# Altium footprint library 全库.PcbLib: 967 footprints (part 5 of 61)
Each footprint in its own frame and in the unit in brackets; x right, y up, seen from the top. Pads: shape width x height; smd on the part's side, far side on the other; paste and mask are expansions set on the pad; w line width, h text height; cw(c..) or ccw(c..) is an arc to the next point about the centre after c.
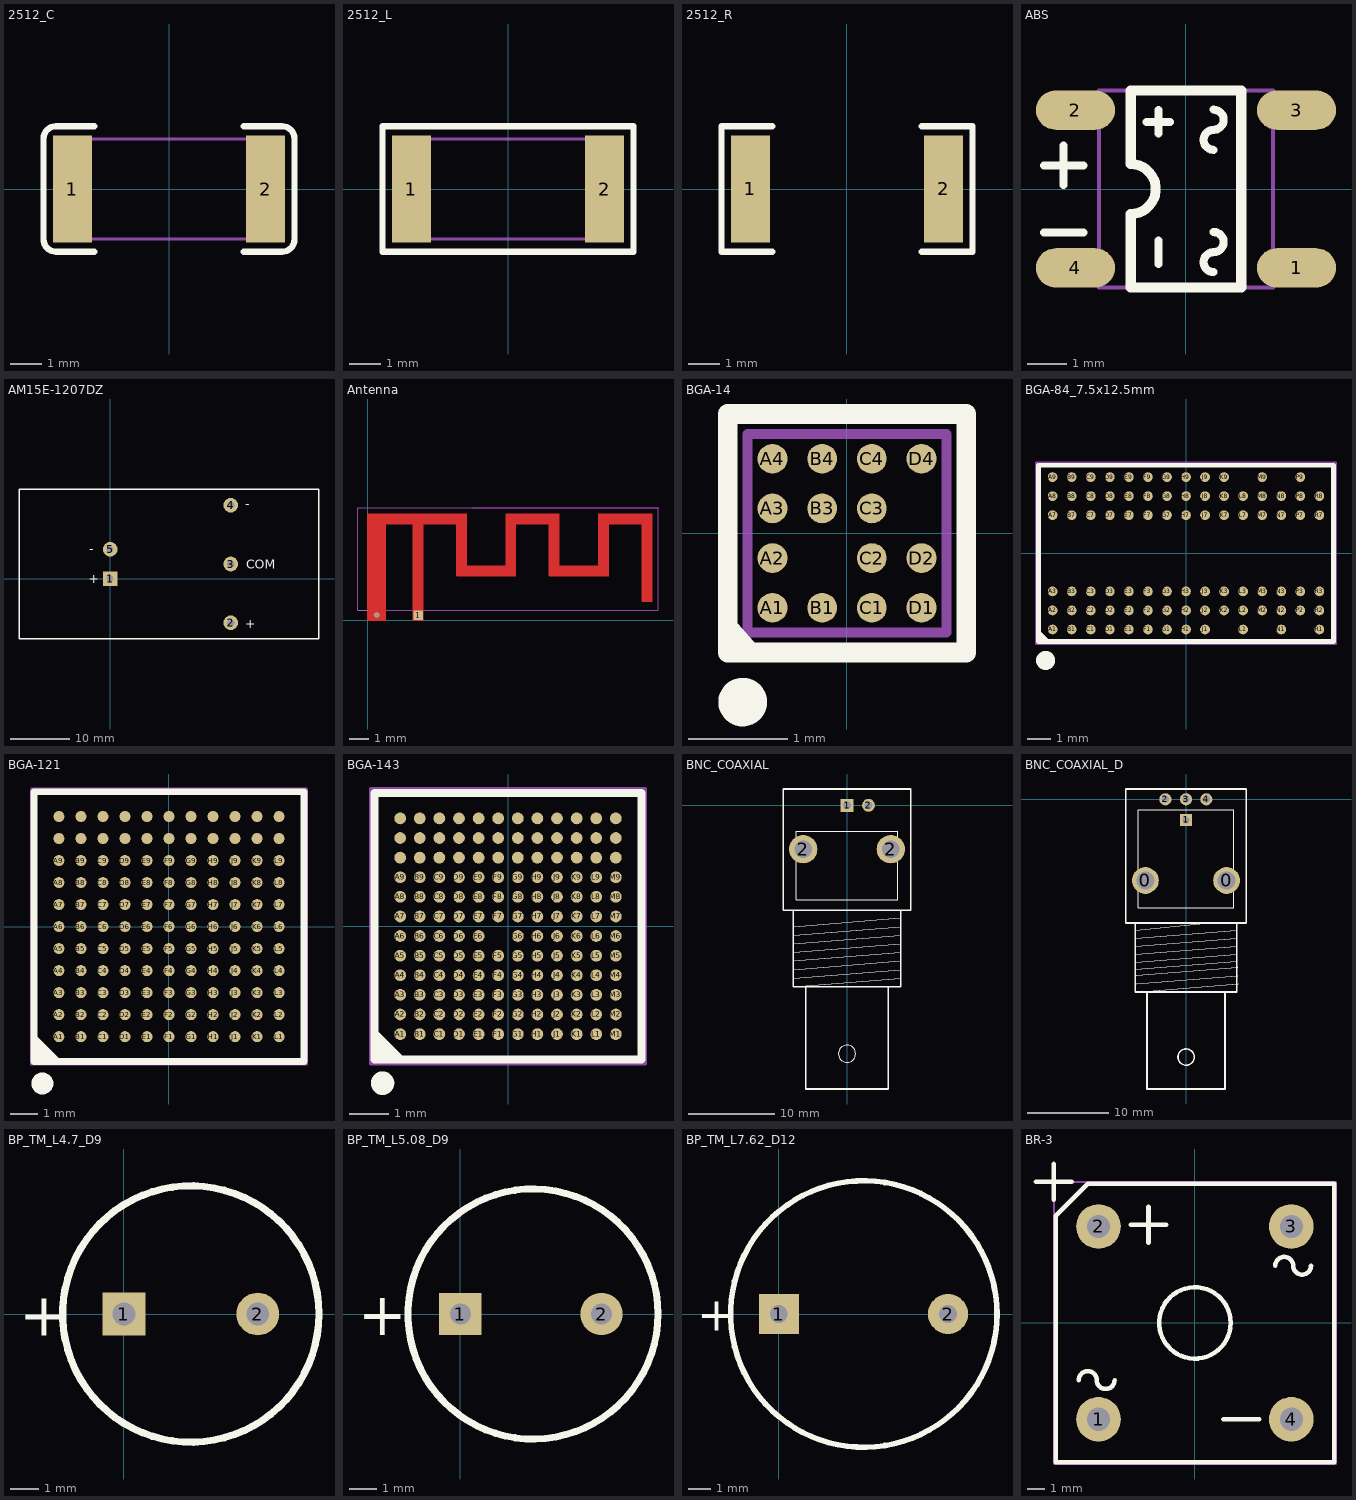
[diagram p4: the footprints below, top view; thin cyan lines are the x and y axes]

## 2512_C [mm]
pads (2):
  rect 1.25x3.42 smd: 1(-3.1,0) 2(3.1,0)
Top Overlay:
  lines w0.203: -2.4,-2.01 -3.625,-2.01 cw(c-3.625,-1.61) -4.025,-1.61 -4.025,1.61 cw(c-3.625,1.61) -3.625,2.01 -2.4,2.01 ; 2.4,-2.01 3.625,-2.01 ccw(c3.625,-1.61) 4.025,-1.61 4.025,1.61 ccw(c3.625,1.61) 3.625,2.01 2.4,2.01
Mechanical 13:
  lines w0.1: -3.15,-1.6 -3.15,1.6 3.15,1.6 3.15,-1.6 -3.15,-1.6

## 2512_L [mm]
pads (2):
  rect 1.25x3.42 smd: 1(-3.1,0) 2(3.1,0)
Top Overlay:
  lines w0.2: -4.025,-2.01 4.025,-2.01 4.025,2.01 -4.025,2.01 -4.025,-2.01
Mechanical 13:
  lines w0.1: -3.15,-1.6 3.15,-1.6 3.15,1.6 -3.15,1.6 -3.15,-1.6

## 2512_R [mm]
pads (2):
  rect 1.25x3.42 smd: 1(-3.1,0) 2(3.1,0)
Top Overlay:
  lines w0.2: -2.4,-2.01 -4.025,-2.01 -4.025,2.01 -2.4,2.01 ; 2.4,-2.01 4.025,-2.01 4.025,2.01 2.4,2.01
3D body "User Library-res2512_body.STEP": height 0.62, standoff 0, extent -3.159,-1.6 3.16,1.6

## ABS [mm]
pads (4):
  oval 2x1 smd: 1(2.8,-2) 2(-2.8,2) 3(2.8,2) 4(-2.8,-2)
Top Overlay:
  lines w0.203: -3.6,-1.1 -2.6,-1.1 ; -3.6,0.6 -2.6,0.6 ; -3.1,0.1 -3.1,1.1 ; -1,1.7 -0.4,1.7 ; -0.7,-1.9 -0.7,-1.3 ; -0.7,1.4 -0.7,2 ; 0.7,-2.108 cw(c0.7,-1.854) 0.7,-1.6 ccw(c0.7,-1.346) 0.7,-1.092 ; 0.7,0.992 cw(c0.7,1.246) 0.7,1.5 ccw(c0.7,1.754) 0.7,2.008
  lines w0.254: -1.4,-2.5 -1.4,-0.635 ccw(c-1.4,0) -1.4,0.635 -1.4,2.5 1.4,2.5 1.4,-2.5 -1.4,-2.5
Mechanical 13:
  lines w0.1: -2.2,-2.5 -2.2,2.5 2.2,2.5 2.2,-2.5 -2.2,-2.5

## AM15E-1207DZ [mm]
pads (5):
  rect 2.5x2.5 hole 1.2: 1(0,0)
  round 2.5 hole 1.2: 2(20.5,-7.5) 3(20.5,2.5) 4(20.5,12.5) 5(0,5)
Top Overlay:
  lines w0.254: -15.5,-10.25 -15.5,15.25 35.5,15.25 35.5,-10.25 -15.5,-10.25
  text "COM" at 23.114,1.651 h1.52
  text "-" at 22.987,11.938 h1.52
  text "+" at 22.987,-8.382 h1.52
  text "+" at -3.683,-0.762 h1.52
  text "-" at -3.556,4.318 h1.52

## Antenna [mm]
pads (1):
  rect 0.5x0.5 smd: 1(2.55,0.25)
via 0.45,0.25 diameter 0.254 hole 0.203
Top Layer:
  lines w0.025: 0,0.013 0.9,0.013 ; 0,0.038 0.9,0.038 ; 0,0.064 0.9,0.064 ; 0,0.089 0.9,0.089 ; 0,0.114 0.9,0.114 ; 0,0.14 0.9,0.14 ; 0,0.165 0.9,0.165 ; 0,0.191 0.9,0.191 ; 0,0.216 0.9,0.216 ; 0,0.241 0.9,0.241 ; 0,0.267 0.9,0.267 ; 0,0.292 0.9,0.292 ; 0,0.318 0.9,0.318 ; 0,0.343 0.9,0.343 ; 0,0.368 0.9,0.368 ; 0,0.394 0.9,0.394 ; 0,0.419 0.9,0.419 ; 0,0.445 0.9,0.445 ; 0,0.47 0.9,0.47 ; 0,0.495 0.9,0.495 ; 0,0.521 0.9,0.521 ; 0,0.546 0.9,0.546 ; 0,0.572 0.9,0.572 ; 0,0.597 0.9,0.597 ; 0,0.622 0.9,0.622 ; 0,0.648 0.9,0.648 ; 0,0.673 0.9,0.673 ; 0,0.699 0.9,0.699 ; 0,0.724 0.9,0.724 ; 0,0.749 0.9,0.749 ; 0,0.775 0.9,0.775 ; 0,0.8 0.9,0.8 ; 0,0.826 0.9,0.826 ; 0,0.851 0.9,0.851 ; 0,0.876 0.9,0.876 ; 0,0.902 0.9,0.902 ; 0,0.927 0.9,0.927 ; 0,0.953 0.9,0.953 ; 0,0.978 0.9,0.978 ; 0,1.003 0.9,1.003 ; 0,1.029 0.9,1.029 ; 0,1.054 0.9,1.054 ; 0,1.079 0.9,1.079 ; 0,1.105 0.9,1.105 ; 0,1.13 0.9,1.13 ; 0,1.156 0.9,1.156 ; 0,1.181 0.9,1.181 ; 0,1.206 0.9,1.206 ; 0,1.232 0.9,1.232 ; 0,1.257 0.9,1.257 ; 0,1.283 0.9,1.283 ; 0,1.308 0.9,1.308 ; 0,1.333 0.9,1.333 ; 0,1.359 0.9,1.359 ; 0,1.384 0.9,1.384 ; 0,1.41 0.9,1.41 ; 0,1.435 0.9,1.435 ; 0,1.46 0.9,1.46 ; 0,1.486 0.9,1.486 ; 0,1.511 0.9,1.511 ; 0,1.537 0.9,1.537 ; 0,1.562 0.9,1.562 ; 0,1.587 0.9,1.587 ; 0,1.613 0.9,1.613 ; 0,1.638 0.9,1.638 ; 0,1.664 0.9,1.664 ; 0,1.689 0.9,1.689 ; 0,1.714 0.9,1.714 ; 0,1.74 0.9,1.74 ; 0,1.765 0.9,1.765 ; 0,1.791 0.9,1.791 ; 0,1.816 0.9,1.816 ; 0,1.841 0.9,1.841 ; 0,1.867 0.9,1.867 ; 0,1.892 0.9,1.892 ; 0,1.918 0.9,1.918 ; 0,1.943 0.9,1.943 ; 0,1.968 0.9,1.968 ; 0,1.994 0.9,1.994 ; 0,2.019 0.9,2.019 ; 0,2.045 0.9,2.045 ; 0,2.07 0.9,2.07 ; 0,2.095 0.9,2.095 ; 0,2.121 0.9,2.121 ; 0,2.146 0.9,2.146 ; 0,2.172 0.9,2.172 ; 0,2.197 0.9,2.197 ; 0,2.222 0.9,2.222 ; 0,2.248 0.9,2.248 ; 0,2.273 0.9,2.273 ; 0,2.299 0.9,2.299 ; 0,2.324 0.9,2.324 ; 0,2.349 0.9,2.349 ; 0,2.375 0.9,2.375 ; 0,2.4 0.9,2.4 ; 0,2.426 0.9,2.426 ; 0,2.451 0.9,2.451 ; 0,2.476 0.9,2.476 ; 0,2.502 0.9,2.502 ; 0,2.527 0.9,2.527 ; 0,2.553 0.9,2.553 ; 0,2.578 0.9,2.578 ; 0,2.603 0.9,2.603 ; 0,2.629 0.9,2.629 ; 0,2.654 0.9,2.654 ; 0,2.68 0.9,2.68 ; 0,2.705 0.9,2.705 ; 0,2.73 0.9,2.73 ; 0,2.756 0.9,2.756 ; 0,2.781 0.9,2.781 ; 0,2.807 0.9,2.807 ; 0,2.832 0.9,2.832 ; 0,2.857 0.9,2.857 ; 0,2.883 0.9,2.883 ; 0,2.908 0.9,2.908 ; 0,2.934 0.9,2.934 ; 0,2.959 0.9,2.959 ; 0,2.984 0.9,2.984 ; 0,3.01 0.9,3.01 ; 0,3.035 0.9,3.035 ; 0,3.061 0.9,3.061 ; 0,3.086 0.9,3.086 ; 0,3.111 0.9,3.111 ; 0,3.137 0.9,3.137 ; 0,3.162 0.9,3.162 ; 0,3.188 0.9,3.188 ; 0,3.213 0.9,3.213 ; 0,3.238 0.9,3.238 ; 0,3.264 0.9,3.264 ; 0,3.289 0.9,3.289 ; 0,3.315 0.9,3.315 ; 0,3.34 0.9,3.34 ; 0,3.365 0.9,3.365 ; 0,3.391 0.9,3.391 ; 0,3.416 0.9,3.416 ; 0,3.442 0.9,3.442 ; 0,3.467 0.9,3.467 ; 0,3.492 0.9,3.492 ; 0,3.518 0.9,3.518 ; 0,3.543 0.9,3.543 ; 0,3.569 0.9,3.569 ; 0,3.594 0.9,3.594 ; 0,3.619 0.9,3.619 ; 0,3.645 0.9,3.645 ; 0,3.67 0.9,3.67 ; 0,3.696 0.9,3.696 ; 0,3.721 0.9,3.721 ; 0,3.746 0.9,3.746 ; 0,3.772 0.9,3.772 ; 0,3.797 0.9,3.797 ; 0,3.823 0.9,3.823 ; 0,3.848 0.9,3.848 ; 0,3.873 0.9,3.873 ; 0,3.899 0.9,3.899 ; 0,3.924 0.9,3.924 ; 0,3.95 0.9,3.95 ; 0,3.975 0.9,3.975 ; 0,4 0.9,4 ; 0,4.026 0.9,4.026 ; 0,4.051 0.9,4.051 ; 0,4.077 0.9,4.077 ; 0,4.102 0.9,4.102 ; 0,4.127 0.9,4.127 ; 0,4.153 0.9,4.153 ; 0,4.178 0.9,4.178 ; 0,4.204 0.9,4.204 ; 0,4.229 0.9,4.229 ; 0,4.255 0.9,4.255 ; 0,4.28 0.9,4.28 ; 0,4.305 0.9,4.305 ; 0,4.331 0.9,4.331 ; 0,4.356 0.9,4.356 ; 0,4.381 0.9,4.381 ; 0,4.407 0.9,4.407 ; 0,4.432 0.9,4.432 ; 0,4.458 0.9,4.458 ; 0,4.483 0.9,4.483 ; 0,4.508 0.9,4.508 ; 0,4.534 0.9,4.534 ; 0,4.559 0.9,4.559 ; 0,4.585 0.9,4.585 ; 0,4.61 0.9,4.61 ; 0,4.635 0.9,4.635 ; 0,4.661 0.9,4.661 ; 0,4.686 0.9,4.686 ; 0,4.712 0.9,4.712 ; 0,4.737 0.9,4.737 ; 0,4.763 0.9,4.763 ; 0,4.788 0.9,4.788 ; 0,4.813 0.9,4.813 ; 0,4.839 0.9,4.839 ; 0,4.864 0.9,4.864 ; 0,4.903 5,4.903 ; 0,4.915 0.9,4.915 ; 0,4.928 5,4.928 ; 0,4.94 0.9,4.94 ; 0,4.953 5,4.953 ; 0,4.966 0.9,4.966 ; 0,4.979 5,4.979 ; 0,4.991 0.9,4.991 ; 0,5.004 5,5.004 ; 0,5.016 0.9,5.016 ; 0,5.03 5,5.03 ; 0,5.042 0.9,5.042 ; 0,5.055 5,5.055 ; 0,5.067 0.9,5.067 ; 0,5.08 5,5.08 ; 0,5.093 0.9,5.093 ; 0,5.106 5,5.106 ; 0,5.118 0.9,5.118 ; 0,5.131 5,5.131 ; 0,5.143 0.9,5.143 ; 0,5.157 5,5.157 ; 0,5.169 0.9,5.169 ; 0,5.182 5,5.182 ; 0,5.194 0.9,5.194 ; 0,5.207 5,5.207 ; 0,5.22 0.9,5.22 ; 0,5.233 5,5.233 ; 0,5.245 0.9,5.245 ; 0,5.258 5,5.258 ; 0,5.271 0.9,5.271 ; 0,5.284 5,5.284 ; 0,5.296 0.9,5.296 ; 0,5.309 5,5.309 ; 0,5.321 0.9,5.321 ; 0,5.334 5,5.334 ; 0,5.347 0.9,5.347 ; 0,5.36 5,5.36 ; 0,5.372 0.9,5.372 ; 0,5.385 5,5.385 ; 0.9,4.889 0,4.889 ; 2.3,0.013 2.8,0.013 ; 2.3,0.038 2.8,0.038 ; 2.3,0.064 2.8,0.064 ; 2.3,0.089 2.8,0.089 ; 2.3,0.114 2.8,0.114 ; 2.3,0.14 2.8,0.14 ; 2.3,0.165 2.8,0.165 ; 2.3,0.191 2.8,0.191 ; 2.3,0.216 2.8,0.216 ; 2.3,0.241 2.8,0.241 ; 2.3,0.267 2.8,0.267 ; 2.3,0.292 2.8,0.292 ; 2.3,0.318 2.8,0.318 ; 2.3,0.343 2.8,0.343 ; 2.3,0.368 2.8,0.368 ; 2.3,0.394 2.8,0.394 ; 2.3,0.419 2.8,0.419 ; 2.3,0.445 2.8,0.445 ; 2.3,0.47 2.8,0.47 ; 2.3,0.495 2.8,0.495 ; 2.3,0.521 2.8,0.521 ; 2.3,0.546 2.8,0.546 ; 2.3,0.572 2.8,0.572 ; 2.3,0.597 2.8,0.597 ; 2.3,0.622 2.8,0.622 ; 2.3,0.648 2.8,0.648 ; 2.3,0.673 2.8,0.673 ; 2.3,0.699 2.8,0.699 ; 2.3,0.724 2.8,0.724 ; 2.3,0.749 2.8,0.749 ; 2.3,0.775 2.8,0.775 ; 2.3,0.8 2.8,0.8 ; 2.3,0.826 2.8,0.826 ; 2.3,0.851 2.8,0.851 ; 2.3,0.876 2.8,0.876 ; 2.3,0.902 2.8,0.902 ; 2.3,0.927 2.8,0.927 ; 2.3,0.953 2.8,0.953 ; 2.3,0.978 2.8,0.978 ; 2.3,1.003 2.8,1.003 ; 2.3,1.029 2.8,1.029 ; 2.3,1.054 2.8,1.054 ; 2.3,1.079 2.8,1.079 ; 2.3,1.105 2.8,1.105 ; 2.3,1.13 2.8,1.13 ; 2.3,1.156 2.8,1.156 ; 2.3,1.181 2.8,1.181 ; 2.3,1.206 2.8,1.206 ; 2.3,1.232 2.8,1.232 ; 2.3,1.257 2.8,1.257 ; 2.3,1.283 2.8,1.283 ; 2.3,1.308 2.8,1.308 ; 2.3,1.333 2.8,1.333 ; 2.3,1.359 2.8,1.359 ; 2.3,1.384 2.8,1.384 ; 2.3,1.41 2.8,1.41 ; 2.3,1.435 2.8,1.435 ; 2.3,1.46 2.8,1.46 ; 2.3,1.486 2.8,1.486 ; 2.3,1.511 2.8,1.511 ; 2.3,1.537 2.8,1.537 ; 2.3,1.562 2.8,1.562 ; 2.3,1.587 2.8,1.587 ; 2.3,1.613 2.8,1.613 ; 2.3,1.638 2.8,1.638 ; 2.3,1.664 2.8,1.664 ; 2.3,1.689 2.8,1.689 ; 2.3,1.714 2.8,1.714 ; 2.3,1.74 2.8,1.74 ; 2.3,1.765 2.8,1.765 ; 2.3,1.791 2.8,1.791 ; 2.3,1.816 2.8,1.816 ; 2.3,1.841 2.8,1.841 ; 2.3,1.867 2.8,1.867 ; 2.3,1.892 2.8,1.892 ; 2.3,1.918 2.8,1.918 ; 2.3,1.943 2.8,1.943 ; 2.3,1.968 2.8,1.968 ; 2.3,1.994 2.8,1.994 ; 2.3,2.019 2.8,2.019 ; 2.3,2.045 2.8,2.045 ; 2.3,2.07 2.8,2.07 ; 2.3,2.095 2.8,2.095 ; 2.3,2.121 2.8,2.121 ; 2.3,2.146 2.8,2.146 ; 2.3,2.172 2.8,2.172 ; 2.3,2.197 2.8,2.197 ; 2.3,2.222 2.8,2.222 ; 2.3,2.248 2.8,2.248 ; 2.3,2.273 2.8,2.273 ; 2.3,2.299 2.8,2.299 ; 2.3,2.324 2.8,2.324 ; 2.3,2.349 2.8,2.349 ; 2.3,2.375 2.8,2.375 ; 2.3,2.4 2.8,2.4 ; 2.3,2.426 2.8,2.426 ; 2.3,2.451 2.8,2.451 ; 2.3,2.476 2.8,2.476 ; 2.3,2.502 2.8,2.502 ; 2.3,2.527 2.8,2.527 ; 2.3,2.553 2.8,2.553 ; 2.3,2.578 2.8,2.578 ; 2.3,2.603 2.8,2.603 ; 2.3,2.629 2.8,2.629 ; 2.3,2.654 2.8,2.654 ; 2.3,2.68 2.8,2.68 ; 2.3,2.705 2.8,2.705 ; 2.3,2.73 2.8,2.73 ; 2.3,2.756 2.8,2.756 ; 2.3,2.781 2.8,2.781 ; 2.3,2.807 2.8,2.807 ; 2.3,2.832 2.8,2.832 ; 2.3,2.857 2.8,2.857 ; 2.3,2.883 2.8,2.883 ; 2.3,2.908 2.8,2.908 ; 2.3,2.934 2.8,2.934 ; 2.3,2.959 2.8,2.959 ; 2.3,2.984 2.8,2.984 ; 2.3,3.01 2.8,3.01 ; 2.3,3.035 2.8,3.035 ; 2.3,3.061 2.8,3.061 ; 2.3,3.086 2.8,3.086 ; 2.3,3.111 2.8,3.111 ; 2.3,3.137 2.8,3.137 ; 2.3,3.162 2.8,3.162 ; 2.3,3.188 2.8,3.188 ; 2.3,3.213 2.8,3.213 ; 2.3,3.238 2.8,3.238 ; 2.3,3.264 2.8,3.264 ; 2.3,3.289 2.8,3.289 ; 2.3,3.315 2.8,3.315 ; 2.3,3.34 2.8,3.34 ; 2.3,3.365 2.8,3.365 ; 2.3,3.391 2.8,3.391 ; 2.3,3.416 2.8,3.416 ; 2.3,3.442 2.8,3.442 ; 2.3,3.467 2.8,3.467 ; 2.3,3.492 2.8,3.492 ; 2.3,3.518 2.8,3.518 ; 2.3,3.543 2.8,3.543 ; 2.3,3.569 2.8,3.569 ; 2.3,3.594 2.8,3.594 ; 2.3,3.619 2.8,3.619 ; 2.3,3.645 2.8,3.645 ; 2.3,3.67 2.8,3.67 ; 2.3,3.696 2.8,3.696 ; 2.3,3.721 2.8,3.721 ; 2.3,3.746 2.8,3.746 ; 2.3,3.772 2.8,3.772 ; 2.3,3.797 2.8,3.797 ; 2.3,3.823 2.8,3.823 ; 2.3,3.848 2.8,3.848 ; 2.3,3.873 2.8,3.873 ; 2.3,3.899 2.8,3.899 ; 2.3,3.924 2.8,3.924 ; 2.3,3.95 2.8,3.95 ; 2.3,3.975 2.8,3.975 ; 2.3,4 2.8,4 ; 2.3,4.026 2.8,4.026 ; 2.3,4.051 2.8,4.051 ; 2.3,4.077 2.8,4.077 ; 2.3,4.102 2.8,4.102 ; 2.3,4.127 2.8,4.127 ; 2.3,4.153 2.8,4.153 ; 2.3,4.178 2.8,4.178 ; 2.3,4.204 2.8,4.204 ; 2.3,4.229 2.8,4.229 ; 2.3,4.255 2.8,4.255 ; 2.3,4.28 2.8,4.28 ; 2.3,4.305 2.8,4.305 ; 2.3,4.331 2.8,4.331 ; 2.3,4.356 2.8,4.356 ; 2.3,4.381 2.8,4.381 ; 2.3,4.407 2.8,4.407 ; 2.3,4.432 2.8,4.432 ; 2.3,4.458 2.8,4.458 ; 2.3,4.483 2.8,4.483 ; 2.3,4.508 2.8,4.508 ; 2.3,4.534 2.8,4.534 ; 2.3,4.559 2.8,4.559 ; 2.3,4.585 2.8,4.585 ; 2.3,4.61 2.8,4.61 ; 2.3,4.635 2.8,4.635 ; 2.3,4.661 2.8,4.661 ; 2.3,4.686 2.8,4.686 ; 2.3,4.712 2.8,4.712 ; 2.3,4.737 2.8,4.737 ; 2.3,4.763 2.8,4.763 ; 2.3,4.788 2.8,4.788 ; 2.3,4.813 2.8,4.813 ; 2.3,4.839 2.8,4.839 ; 2.3,4.864 2.8,4.864 ; 2.3,4.889 2.8,4.889 ; 2.3,4.915 2.8,4.915 ; 2.3,4.94 2.8,4.94 ; 2.3,4.966 2.8,4.966 ; 2.3,4.991 2.8,4.991 ; 2.3,5.016 2.8,5.016 ; 2.3,5.042 2.8,5.042 ; 2.3,5.067 2.8,5.067 ; 2.3,5.093 2.8,5.093 ; 2.3,5.118 2.8,5.118 ; 2.3,5.143 2.8,5.143 ; 2.3,5.169 2.8,5.169 ; 2.3,5.194 2.8,5.194 ; 2.3,5.22 2.8,5.22 ; 2.3,5.245 2.8,5.245 ; 2.3,5.271 2.8,5.271 ; 2.3,5.296 2.8,5.296 ; 2.3,5.321 2.8,5.321 ; 2.3,5.347 2.8,5.347 ; 2.3,5.372 2.8,5.372 ; 4.5,2.771 5,2.771 ; 4.5,2.796 5,2.796 ; 4.5,2.821 5,2.821 ; 4.5,2.847 5,2.847 ; 4.5,2.872 5,2.872 ; 4.5,2.898 5,2.898 ; 4.5,2.923 5,2.923 ; 4.5,2.948 5,2.948 ; 4.5,2.974 5,2.974 ; 4.5,2.999 5,2.999 ; 4.5,3.025 5,3.025 ; 4.5,3.05 5,3.05 ; 4.5,3.075 5,3.075 ; 4.5,3.101 5,3.101 ; 4.5,3.126 5,3.126 ; 4.5,3.152 5,3.152 ; 4.5,3.177 5,3.177 ; 4.5,3.202 5,3.202 ; 4.5,3.228 5,3.228 ; 4.5,3.253 5,3.253 ; 4.5,3.279 5,3.279 ; 4.5,3.304 5,3.304 ; 4.5,3.329 5,3.329 ; 4.5,3.355 5,3.355 ; 4.5,3.38 5,3.38 ; 4.5,3.406 5,3.406 ; 4.5,3.431 5,3.431 ; 4.5,3.456 5,3.456 ; 4.5,3.482 5,3.482 ; 4.5,3.507 5,3.507 ; 4.5,3.533 5,3.533 ; 4.5,3.558 5,3.558 ; 4.5,3.583 5,3.583 ; 4.5,3.609 5,3.609 ; 4.5,3.634 5,3.634 ; 4.5,3.66 5,3.66 ; 4.5,3.685 5,3.685 ; 4.5,3.71 5,3.71 ; 4.5,3.736 5,3.736 ; 4.5,3.761 5,3.761 ; 4.5,3.787 5,3.787 ; 4.5,3.812 5,3.812 ; 4.5,3.837 5,3.837 ; 4.5,3.863 5,3.863 ; 4.5,3.888 5,3.888 ; 4.5,3.914 5,3.914 ; 4.5,3.939 5,3.939 ; 4.5,3.964 5,3.964 ; 4.5,3.99 5,3.99 ; 4.5,4.015 5,4.015 ; 4.5,4.041 5,4.041 ; 4.5,4.066 5,4.066 ; 4.5,4.091 5,4.091 ; 4.5,4.117 5,4.117 ; 4.5,4.142 5,4.142 ; 4.5,4.168 5,4.168 ; 4.5,4.193 5,4.193 ; 4.5,4.218 5,4.218 ; 4.5,4.244 5,4.244 ; 4.5,4.269 5,4.269 ; 4.5,4.295 5,4.295 ; 4.5,4.32 5,4.32 ; 4.5,4.345 5,4.345 ; 4.5,4.371 5,4.371 ; 4.5,4.396 5,4.396 ; 4.5,4.422 5,4.422 ; 4.5,4.447 5,4.447 ; 4.5,4.472 5,4.472 ; 4.5,4.498 5,4.498 ; 4.5,4.523 5,4.523 ; 4.5,4.549 5,4.549 ; 4.5,4.574 5,4.574 ; 4.5,4.599 5,4.599 ; 4.5,4.625 5,4.625 ; 4.5,4.65 5,4.65 ; 4.5,4.676 5,4.676 ; 4.5,4.701 5,4.701 ; 4.5,4.726 5,4.726 ; 4.5,4.752 5,4.752 ; 4.5,4.777 5,4.777 ; 4.5,4.803 5,4.803 ; 4.5,4.828 5,4.828 ; 4.5,4.853 5,4.853 ; 4.5,4.879 5,4.879 ; 4.5,4.904 5,4.904 ; 4.5,4.93 5,4.93 ; 4.5,4.955 5,4.955 ; 4.5,4.98 5,4.98 ; 4.5,5.006 5,5.006 ; 4.5,5.031 5,5.031 ; 4.5,5.057 5,5.057 ; 4.5,5.082 5,5.082 ; 4.5,5.107 5,5.107 ; 4.5,5.133 5,5.133 ; 4.5,5.158 5,5.158 ; 4.5,5.184 5,5.184 ; 4.5,5.209 5,5.209 ; 4.5,5.234 5,5.234 ; 4.5,5.26 5,5.26 ; 4.5,5.285 5,5.285 ; 4.5,5.311 5,5.311 ; 4.5,5.336 5,5.336 ; 4.5,5.361 5,5.361 ; 4.5,5.387 5,5.387 ; 5,2.263 4.5,2.263 7.5,2.263 7,2.263 ; 5,2.288 4.5,2.288 7.5,2.288 7,2.288 ; 5,2.313 4.5,2.313 7.5,2.313 7,2.313 ; 5,2.339 4.5,2.339 7.5,2.339 7,2.339 ; 5,2.364 4.5,2.364 7.5,2.364 7,2.364 ; 5,2.39 4.5,2.39 7.5,2.39 7,2.39 ; 5,2.415 4.5,2.415 7.5,2.415 7,2.415 ; 5,2.44 4.5,2.44 7.5,2.44 7,2.44 ; 5,2.466 4.5,2.466 7.5,2.466 7,2.466 ; 5,2.491 4.5,2.491 7.5,2.491 7,2.491 ; 5,2.517 4.5,2.517 7.5,2.517 7,2.517 ; 5,2.542 4.5,2.542 7.5,2.542 7,2.542 ; 5,2.567 4.5,2.567 7.5,2.567 7,2.567 ; 5,2.593 4.5,2.593 7.5,2.593 7,2.593 ; 5,2.618 4.5,2.618 7.5,2.618 7,2.618 ; 5,2.644 4.5,2.644 7.5,2.644 7,2.644 ; 5,2.669 4.5,2.669 7.5,2.669 7,2.669 ; 5,2.694 4.5,2.694 7.5,2.694 7,2.694 ; 5,2.72 4.5,2.72 7.5,2.72 7,2.72 ; 5,2.745 4.5,2.745 7.5,2.745 7,2.745 ; 7,2.771 7.5,2.771 ; 7,2.796 7.5,2.796 ; 7,2.821 7.5,2.821 ; 7,2.847 7.5,2.847 ; 7,2.872 7.5,2.872 ; 7,2.898 7.5,2.898 ; 7,2.923 7.5,2.923 ; 7,2.948 7.5,2.948 ; 7,2.974 7.5,2.974 ; 7,2.999 7.5,2.999 ; 7,3.025 7.5,3.025 ; 7,3.05 7.5,3.05 ; 7,3.075 7.5,3.075 ; 7,3.101 7.5,3.101 ; 7,3.126 7.5,3.126 ; 7,3.152 7.5,3.152 ; 7,3.177 7.5,3.177 ; 7,3.202 7.5,3.202 ; 7,3.228 7.5,3.228 ; 7,3.253 7.5,3.253 ; 7,3.279 7.5,3.279 ; 7,3.304 7.5,3.304 ; 7,3.329 7.5,3.329 ; 7,3.355 7.5,3.355 ; 7,3.38 7.5,3.38 ; 7,3.406 7.5,3.406 ; 7,3.431 7.5,3.431 ; 7,3.456 7.5,3.456 ; 7,3.482 7.5,3.482 ; 7,3.507 7.5,3.507 ; 7,3.533 7.5,3.533 ; 7,3.558 7.5,3.558 ; 7,3.583 7.5,3.583 ; 7,3.609 7.5,3.609 ; 7,3.634 7.5,3.634 ; 7,3.66 7.5,3.66 ; 7,3.685 7.5,3.685 ; 7,3.71 7.5,3.71 ; 7,3.736 7.5,3.736 ; 7,3.761 7.5,3.761 ; 7,3.787 7.5,3.787 ; 7,3.812 7.5,3.812 ; 7,3.837 7.5,3.837 ; 7,3.863 7.5,3.863 ; 7,3.888 7.5,3.888 ; 7,3.914 7.5,3.914 ; 7,3.939 7.5,3.939 ; 7,3.964 7.5,3.964 ; 7,3.99 7.5,3.99 ; 7,4.015 7.5,4.015 ; 7,4.041 7.5,4.041 ; 7,4.066 7.5,4.066 ; 7,4.091 7.5,4.091 ; 7,4.117 7.5,4.117 ; 7,4.142 7.5,4.142 ; 7,4.168 7.5,4.168 ; 7,4.193 7.5,4.193 ; 7,4.218 7.5,4.218 ; 7,4.244 7.5,4.244 ; 7,4.269 7.5,4.269 ; 7,4.295 7.5,4.295 ; 7,4.32 7.5,4.32 ; 7,4.345 7.5,4.345 ; 7,4.371 7.5,4.371 ; 7,4.396 7.5,4.396 ; 7,4.422 7.5,4.422 ; 7,4.447 7.5,4.447 ; 7,4.472 7.5,4.472 ; 7,4.498 7.5,4.498 ; 7,4.523 7.5,4.523 ; 7,4.549 7.5,4.549 ; 7,4.574 7.5,4.574 ; 7,4.599 7.5,4.599 ; 7,4.625 7.5,4.625 ; 7,4.65 7.5,4.65 ; 7,4.676 7.5,4.676 ; 7,4.701 7.5,4.701 ; 7,4.726 7.5,4.726 ; 7,4.752 7.5,4.752 ; 7,4.777 7.5,4.777 ; 7,4.803 7.5,4.803 ; 7,4.828 7.5,4.828 ; 7,4.853 7.5,4.853 ; 7,4.879 7.5,4.879 ; 7,4.903 9.7,4.903 ; 7,4.904 7.5,4.904 ; 7,4.928 9.7,4.928 ; 7,4.93 7.5,4.93 ; 7,4.953 9.7,4.953 ; 7,4.955 7.5,4.955 ; 7,4.979 9.7,4.979 ; 7,4.98 7.5,4.98 ; 7,5.004 9.7,5.004 ; 7,5.006 7.5,5.006 ; 7,5.03 9.7,5.03 ; 7,5.031 7.5,5.031 ; 7,5.055 9.7,5.055 ; 7,5.057 7.5,5.057 ; 7,5.08 9.7,5.08 ; 7,5.082 7.5,5.082 ; 7,5.106 9.7,5.106 ; 7,5.107 7.5,5.107 ; 7,5.131 9.7,5.131 ; 7,5.133 7.5,5.133 ; 7,5.157 9.7,5.157 ; 7,5.158 7.5,5.158 ; 7,5.182 9.7,5.182 ; 7,5.184 7.5,5.184 ; 7,5.207 9.7,5.207 ; 7,5.209 7.5,5.209 ; 7,5.233 9.7,5.233 ; 7,5.234 7.5,5.234 ; 7,5.258 9.7,5.258 ; 7,5.26 7.5,5.26 ; 7,5.284 9.7,5.284 ; 7,5.285 7.5,5.285 ; 7,5.309 9.7,5.309 ; 7,5.311 7.5,5.311 ; 7,5.334 9.7,5.334 ; 7,5.336 7.5,5.336 ; 7,5.36 9.7,5.36 ; 7,5.361 7.5,5.361 ; 7,5.385 9.7,5.385 ; 7,5.387 7.5,5.387 ; 9.2,2.771 9.7,2.771 ; 9.2,2.796 9.7,2.796 ; 9.2,2.821 9.7,2.821 ; 9.2,2.847 9.7,2.847 ; 9.2,2.872 9.7,2.872 ; 9.2,2.898 9.7,2.898 ; 9.2,2.923 9.7,2.923 ; 9.2,2.948 9.7,2.948 ; 9.2,2.974 9.7,2.974 ; 9.2,2.999 9.7,2.999 ; 9.2,3.025 9.7,3.025 ; 9.2,3.05 9.7,3.05 ; 9.2,3.075 9.7,3.075 ; 9.2,3.101 9.7,3.101 ; 9.2,3.126 9.7,3.126 ; 9.2,3.152 9.7,3.152 ; 9.2,3.177 9.7,3.177 ; 9.2,3.202 9.7,3.202 ; 9.2,3.228 9.7,3.228 ; 9.2,3.253 9.7,3.253 ; 9.2,3.279 9.7,3.279 ; 9.2,3.304 9.7,3.304 ; 9.2,3.329 9.7,3.329 ; 9.2,3.355 9.7,3.355 ; 9.2,3.38 9.7,3.38 ; 9.2,3.406 9.7,3.406 ; 9.2,3.431 9.7,3.431 ; 9.2,3.456 9.7,3.456 ; 9.2,3.482 9.7,3.482 ; 9.2,3.507 9.7,3.507 ; 9.2,3.533 9.7,3.533 ; 9.2,3.558 9.7,3.558 ; 9.2,3.583 9.7,3.583 ; 9.2,3.609 9.7,3.609 ; 9.2,3.634 9.7,3.634 ; 9.2,3.66 9.7,3.66 ; 9.2,3.685 9.7,3.685 ; 9.2,3.71 9.7,3.71 ; 9.2,3.736 9.7,3.736 ; 9.2,3.761 9.7,3.761 ; 9.2,3.787 9.7,3.787 ; 9.2,3.812 9.7,3.812 ; 9.2,3.837 9.7,3.837 ; 9.2,3.863 9.7,3.863 ; 9.2,3.888 9.7,3.888 ; 9.2,3.914 9.7,3.914 ; 9.2,3.939 9.7,3.939 ; 9.2,3.964 9.7,3.964 ; 9.2,3.99 9.7,3.99 ; 9.2,4.015 9.7,4.015 ; 9.2,4.041 9.7,4.041 ; 9.2,4.066 9.7,4.066 ; 9.2,4.091 9.7,4.091 ; 9.2,4.117 9.7,4.117 ; 9.2,4.142 9.7,4.142 ; 9.2,4.168 9.7,4.168 ; 9.2,4.193 9.7,4.193 ; 9.2,4.218 9.7,4.218 ; 9.2,4.244 9.7,4.244 ; 9.2,4.269 9.7,4.269 ; 9.2,4.295 9.7,4.295 ; 9.2,4.32 9.7,4.32 ; 9.2,4.345 9.7,4.345 ; 9.2,4.371 9.7,4.371 ; 9.2,4.396 9.7,4.396 ; 9.2,4.422 9.7,4.422 ; 9.2,4.447 9.7,4.447 ; 9.2,4.472 9.7,4.472 ; 9.2,4.498 9.7,4.498 ; 9.2,4.523 9.7,4.523 ; 9.2,4.549 9.7,4.549 ; 9.2,4.574 9.7,4.574 ; 9.2,4.599 9.7,4.599 ; 9.2,4.625 9.7,4.625 ; 9.2,4.65 9.7,4.65 ; 9.2,4.676 9.7,4.676 ; 9.2,4.701 9.7,4.701 ; 9.2,4.726 9.7,4.726 ; 9.2,4.752 9.7,4.752 ; 9.2,4.777 9.7,4.777 ; 9.2,4.803 9.7,4.803 ; 9.2,4.828 9.7,4.828 ; 9.2,4.853 9.7,4.853 ; 9.2,4.879 9.7,4.879 ; 9.2,4.904 9.7,4.904 ; 9.2,4.93 9.7,4.93 ; 9.2,4.955 9.7,4.955 ; 9.2,4.98 9.7,4.98 ; 9.2,5.006 9.7,5.006 ; 9.2,5.031 9.7,5.031 ; 9.2,5.057 9.7,5.057 ; 9.2,5.082 9.7,5.082 ; 9.2,5.107 9.7,5.107 ; 9.2,5.133 9.7,5.133 ; 9.2,5.158 9.7,5.158 ; 9.2,5.184 9.7,5.184 ; 9.2,5.209 9.7,5.209 ; 9.2,5.234 9.7,5.234 ; 9.2,5.26 9.7,5.26 ; 9.2,5.285 9.7,5.285 ; 9.2,5.311 9.7,5.311 ; 9.2,5.336 9.7,5.336 ; 9.2,5.361 9.7,5.361 ; 9.2,5.387 9.7,5.387 ; 9.7,2.263 9.2,2.263 12.2,2.263 11.7,2.263 ; 9.7,2.288 9.2,2.288 12.2,2.288 11.7,2.288 ; 9.7,2.313 9.2,2.313 12.2,2.313 11.7,2.313 ; 9.7,2.339 9.2,2.339 12.2,2.339 11.7,2.339 ; 9.7,2.364 9.2,2.364 12.2,2.364 11.7,2.364 ; 9.7,2.39 9.2,2.39 12.2,2.39 11.7,2.39 ; 9.7,2.415 9.2,2.415 12.2,2.415 11.7,2.415 ; 9.7,2.44 9.2,2.44 12.2,2.44 11.7,2.44 ; 9.7,2.466 9.2,2.466 12.2,2.466 11.7,2.466 ; 9.7,2.491 9.2,2.491 12.2,2.491 11.7,2.491 ; 9.7,2.517 9.2,2.517 12.2,2.517 11.7,2.517 ; 9.7,2.542 9.2,2.542 12.2,2.542 11.7,2.542 ; 9.7,2.567 9.2,2.567 12.2,2.567 11.7,2.567 ; 9.7,2.593 9.2,2.593 12.2,2.593 11.7,2.593 ; 9.7,2.618 9.2,2.618 12.2,2.618 11.7,2.618 ; 9.7,2.644 9.2,2.644 12.2,2.644 11.7,2.644 ; 9.7,2.669 9.2,2.669 12.2,2.669 11.7,2.669 ; 9.7,2.694 9.2,2.694 12.2,2.694 11.7,2.694 ; 9.7,2.72 9.2,2.72 12.2,2.72 11.7,2.72 ; 9.7,2.745 9.2,2.745 12.2,2.745 11.7,2.745 ; 11.7,2.771 12.2,2.771 ; 11.7,2.796 12.2,2.796 ; 11.7,2.821 12.2,2.821 ; 11.7,2.847 12.2,2.847 ; 11.7,2.872 12.2,2.872 ; 11.7,2.898 12.2,2.898 ; 11.7,2.923 12.2,2.923 ; 11.7,2.948 12.2,2.948 ; 11.7,2.974 12.2,2.974 ; 11.7,2.999 12.2,2.999 ; 11.7,3.025 12.2,3.025 ; 11.7,3.05 12.2,3.05 ; 11.7,3.075 12.2,3.075 ; 11.7,3.101 12.2,3.101 ; 11.7,3.126 12.2,3.126 ; 11.7,3.152 12.2,3.152 ; 11.7,3.177 12.2,3.177 ; 11.7,3.202 12.2,3.202 ; 11.7,3.228 12.2,3.228 ; 11.7,3.253 12.2,3.253 ; 11.7,3.279 12.2,3.279 ; 11.7,3.304 12.2,3.304 ; 11.7,3.329 12.2,3.329 ; 11.7,3.355 12.2,3.355 ; 11.7,3.38 12.2,3.38 ; 11.7,3.406 12.2,3.406 ; 11.7,3.431 12.2,3.431 ; 11.7,3.456 12.2,3.456 ; 11.7,3.482 12.2,3.482 ; 11.7,3.507 12.2,3.507 ; 11.7,3.533 12.2,3.533 ; 11.7,3.558 12.2,3.558 ; 11.7,3.583 12.2,3.583 ; 11.7,3.609 12.2,3.609 ; 11.7,3.634 12.2,3.634 ; 11.7,3.66 12.2,3.66 ; 11.7,3.685 12.2,3.685 ; 11.7,3.71 12.2,3.71 ; 11.7,3.736 12.2,3.736 ; 11.7,3.761 12.2,3.761 ; 11.7,3.787 12.2,3.787 ; 11.7,3.812 12.2,3.812 ; 11.7,3.837 12.2,3.837 ; 11.7,3.863 12.2,3.863 ; 11.7,3.888 12.2,3.888 ; 11.7,3.914 12.2,3.914 ; 11.7,3.939 12.2,3.939 ; 11.7,3.964 12.2,3.964 ; 11.7,3.99 12.2,3.99 ; 11.7,4.015 12.2,4.015 ; 11.7,4.041 12.2,4.041 ; 11.7,4.066 12.2,4.066 ; 11.7,4.091 12.2,4.091 ; 11.7,4.117 12.2,4.117 ; 11.7,4.142 12.2,4.142 ; 11.7,4.168 12.2,4.168 ; 11.7,4.193 12.2,4.193 ; 11.7,4.218 12.2,4.218 ; 11.7,4.244 12.2,4.244 ; 11.7,4.269 12.2,4.269 ; 11.7,4.295 12.2,4.295 ; 11.7,4.32 12.2,4.32 ; 11.7,4.345 12.2,4.345 ; 11.7,4.371 12.2,4.371 ; 11.7,4.396 12.2,4.396 ; 11.7,4.422 12.2,4.422 ; 11.7,4.447 12.2,4.447 ; 11.7,4.472 12.2,4.472 ; 11.7,4.498 12.2,4.498 ; 11.7,4.523 12.2,4.523 ; 11.7,4.549 12.2,4.549 ; 11.7,4.574 12.2,4.574 ; 11.7,4.599 12.2,4.599 ; 11.7,4.625 12.2,4.625 ; 11.7,4.65 12.2,4.65 ; 11.7,4.676 12.2,4.676 ; 11.7,4.701 12.2,4.701 ; 11.7,4.726 12.2,4.726 ; 11.7,4.752 12.2,4.752 ; 11.7,4.777 12.2,4.777 ; 11.7,4.803 12.2,4.803 ; 11.7,4.828 12.2,4.828 ; 11.7,4.853 12.2,4.853 ; 11.7,4.879 12.2,4.879 ; 11.7,4.903 14.4,4.903 ; 11.7,4.904 12.2,4.904 ; 11.7,4.928 14.4,4.928 ; 11.7,4.93 12.2,4.93 ; 11.7,4.953 14.4,4.953 ; 11.7,4.955 12.2,4.955 ; 11.7,4.979 14.4,4.979 ; 11.7,4.98 12.2,4.98 ; 11.7,5.004 14.4,5.004 ; 11.7,5.006 12.2,5.006 ; 11.7,5.03 14.4,5.03 ; 11.7,5.031 12.2,5.031 ; 11.7,5.055 14.4,5.055 ; 11.7,5.057 12.2,5.057 ; 11.7,5.08 14.4,5.08 ; 11.7,5.082 12.2,5.082 ; 11.7,5.106 14.4,5.106 ; 11.7,5.107 12.2,5.107 ; 11.7,5.131 